# Altium integrated library LEMO Unipole And Multipole Type Connectors.IntLib: 1566 symbols (part 11 of 13) (continued)
## PKG.M0.5GL.NA (continued)
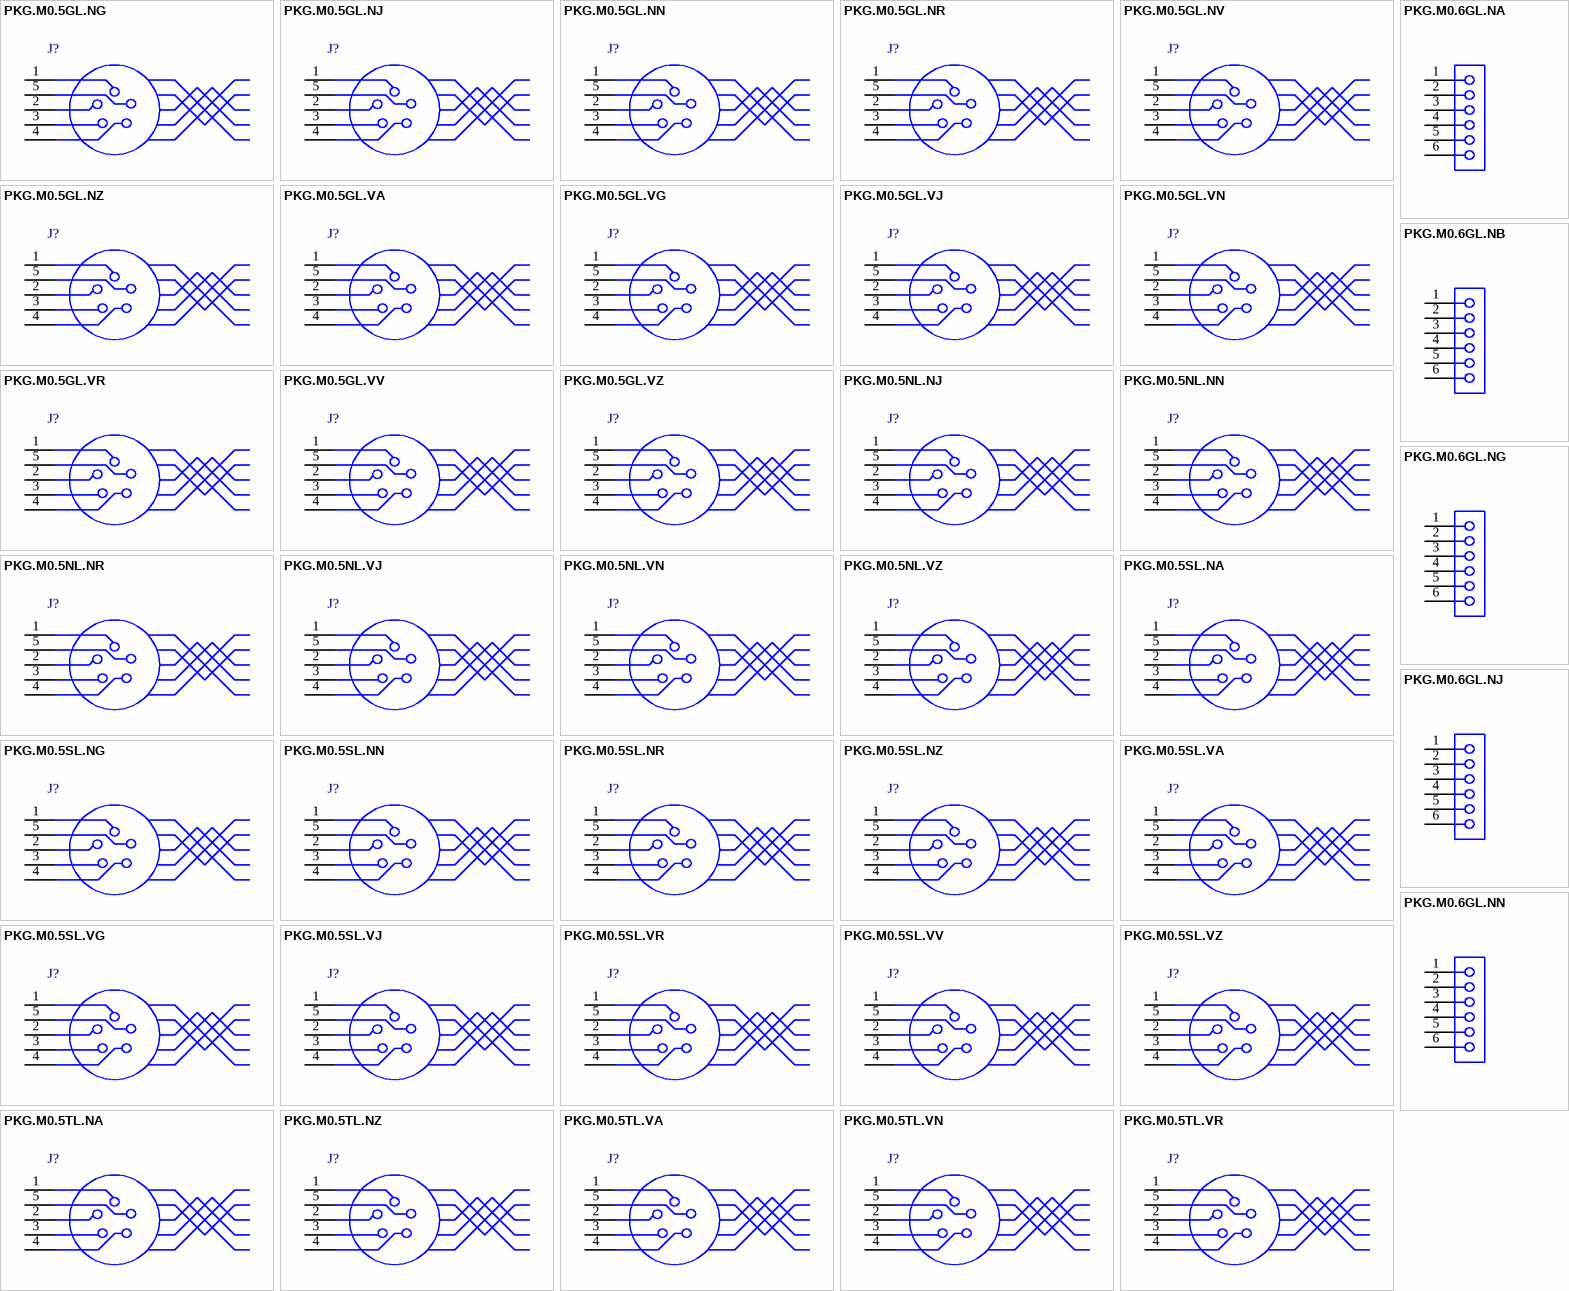
[diagram p35: symbols PKG.M0.5GL.NG to PKG.M0.6GL.NN]

## PKG.M0.5GL.NG
designator J?
Fixed receptacle with two nuts (back panel mounting), straight print contacts, Key (G), P series, Multipole Type with 5 Contacts; Manufacturer: LEMO; PartNumber: PKG.M0.5GL.NG; Number of contacts: 5; Contact Diameter: 0.9 mm; Test voltage (kV rms) Contact-Contact: 1.05; Rated Current(A): 7; DatasheetVersion: Jun-14; PackageReference: PKG.M0.5GL.NG; PackageDescription: Fixed receptacle with two nuts (back panel mounting), straight print contacts, Key(G) for Printed Circuit; ComponentLink1Description: Manufacturer URL; ComponentLink1URL: http://www.lemo.com; ComponentLink2Description: Datasheet; ComponentLink2URL: http://intra.lemo.ch/catalog/ROW/UK_English/P_series_catalog.pdf
footprint PKG.M0.5GL.NG (Socket, Female, Height 33.5 mm, Through hole)
pins: 1, 2, 3, 4, 5

## PKG.M0.5GL.NJ
designator J?
Fixed receptacle with two nuts (back panel mounting), straight print contacts, Key (G), P series, Multipole Type with 5 Contacts; Manufacturer: LEMO; PartNumber: PKG.M0.5GL.NJ; Number of contacts: 5; Contact Diameter: 0.9 mm; Test voltage (kV rms) Contact-Contact: 1.05; Rated Current(A): 7; DatasheetVersion: Jun-14; PackageReference: PKG.M0.5GL.NJ; PackageDescription: Fixed receptacle with two nuts (back panel mounting), straight print contacts, Key(G) for Printed Circuit; ComponentLink1Description: Manufacturer URL; ComponentLink1URL: http://www.lemo.com; ComponentLink2Description: Datasheet; ComponentLink2URL: http://intra.lemo.ch/catalog/ROW/UK_English/P_series_catalog.pdf
footprint PKG.M0.5GL.NJ (Socket, Female, Height 33.5 mm, Through hole)
pins: 1, 2, 3, 4, 5

## PKG.M0.5GL.NN
designator J?
Fixed receptacle with two nuts (back panel mounting), straight print contacts, Key (G), P series, Multipole Type with 5 Contacts; Manufacturer: LEMO; PartNumber: PKG.M0.5GL.NN; Number of contacts: 5; Contact Diameter: 0.9 mm; Test voltage (kV rms) Contact-Contact: 1.05; Rated Current(A): 7; DatasheetVersion: Jun-14; PackageReference: PKG.M0.5GL.NN; PackageDescription: Fixed receptacle with two nuts (back panel mounting), straight print contacts, Key(G) for Printed Circuit; ComponentLink1Description: Manufacturer URL; ComponentLink1URL: http://www.lemo.com; ComponentLink2Description: Datasheet; ComponentLink2URL: http://intra.lemo.ch/catalog/ROW/UK_English/P_series_catalog.pdf
footprint PKG.M0.5GL.NN (Socket, Female, Height 33.5 mm, Through hole)
pins: 1, 2, 3, 4, 5

## PKG.M0.5GL.NR
designator J?
Fixed receptacle with two nuts (back panel mounting), straight print contacts, Key (G), P series, Multipole Type with 5 Contacts; Manufacturer: LEMO; PartNumber: PKG.M0.5GL.NR; Number of contacts: 5; Contact Diameter: 0.9 mm; Test voltage (kV rms) Contact-Contact: 1.05; Rated Current(A): 7; DatasheetVersion: Jun-14; PackageReference: PKG.M0.5GL.NR; PackageDescription: Fixed receptacle with two nuts (back panel mounting), straight print contacts, Key(G) for Printed Circuit; ComponentLink1Description: Manufacturer URL; ComponentLink1URL: http://www.lemo.com; ComponentLink2Description: Datasheet; ComponentLink2URL: http://intra.lemo.ch/catalog/ROW/UK_English/P_series_catalog.pdf
footprint PKG.M0.5GL.NR (Socket, Female, Height 33.5 mm, Through hole)
pins: 1, 2, 3, 4, 5

## PKG.M0.5GL.NV
designator J?
Fixed receptacle with two nuts (back panel mounting), straight print contacts, Key (G), P series, Multipole Type with 5 Contacts; Manufacturer: LEMO; PartNumber: PKG.M0.5GL.NV; Number of contacts: 5; Contact Diameter: 0.9 mm; Test voltage (kV rms) Contact-Contact: 1.05; Rated Current(A): 7; DatasheetVersion: Jun-14; PackageReference: PKG.M0.5GL.NV; PackageDescription: Fixed receptacle with two nuts (back panel mounting), straight print contacts, Key(G) for Printed Circuit; ComponentLink1Description: Manufacturer URL; ComponentLink1URL: http://www.lemo.com; ComponentLink2Description: Datasheet; ComponentLink2URL: http://intra.lemo.ch/catalog/ROW/UK_English/P_series_catalog.pdf
footprint PKG.M0.5GL.NV (Socket, Female, Height 33.5 mm, Through hole)
pins: 1, 2, 3, 4, 5

## PKG.M0.5GL.NZ
designator J?
Fixed receptacle with 1 nut (without 2nd front nut), Key (G), P series, Multipole Type with 5 Contacts; Manufacturer: LEMO; PartNumber: PKG.M0.5GL.NZ; Number of contacts: 5; Contact Diameter: 0.9 mm; Test voltage (kV rms) Contact-Contact: 1.05; Rated Current(A): 7; DatasheetVersion: Jun-14; PackageReference: PKG.M0.5GL.NZ; PackageDescription: Fixed receptacle with 1 nut (without 2nd front nut), Key(G) for Printed Circuit; ComponentLink1Description: Manufacturer URL; ComponentLink1URL: http://www.lemo.com; ComponentLink2Description: Datasheet; ComponentLink2URL: http://intra.lemo.ch/catalog/ROW/UK_English/P_series_catalog.pdf
footprint PKG.M0.5GL.NZ (Socket, Female, Height 25 mm, Through hole)
pins: 1, 2, 3, 4, 5

## PKG.M0.5GL.VA
designator J?
Fixed receptacle with two nuts (back panel mounting), 90° print contacts, Key (G), P series, Multipole Type with 5 Contacts; Manufacturer: LEMO; PartNumber: PKG.M0.5GL.VA; Number of contacts: 5; Contact Diameter: 0.9 mm; Test voltage (kV rms) Contact-Contact: 1.05; Rated Current(A): 7; DatasheetVersion: Jun-14; PackageReference: PKG.M0.5GL.VA; PackageDescription: Fixed receptacle with two nuts (back panel mounting), 90° print contacts, Key(G) for Printed Circuit; ComponentLink1Description: Manufacturer URL; ComponentLink1URL: http://www.lemo.com; ComponentLink2Description: Datasheet; ComponentLink2URL: http://intra.lemo.ch/catalog/ROW/UK_English/P_series_catalog.pdf
footprint PKG.M0.5GL.VA (Socket, Female, Height 33.5 mm, Through hole)
pins: 1, 2, 3, 4, 5

## PKG.M0.5GL.VG
designator J?
Fixed receptacle with two nuts (back panel mounting), 90° print contacts, Key (G), P series, Multipole Type with 5 Contacts; Manufacturer: LEMO; PartNumber: PKG.M0.5GL.VG; Number of contacts: 5; Contact Diameter: 0.9 mm; Test voltage (kV rms) Contact-Contact: 1.05; Rated Current(A): 7; DatasheetVersion: Jun-14; PackageReference: PKG.M0.5GL.VG; PackageDescription: Fixed receptacle with two nuts (back panel mounting), 90° print contacts, Key(G) for Printed Circuit; ComponentLink1Description: Manufacturer URL; ComponentLink1URL: http://www.lemo.com; ComponentLink2Description: Datasheet; ComponentLink2URL: http://intra.lemo.ch/catalog/ROW/UK_English/P_series_catalog.pdf
footprint PKG.M0.5GL.VG (Socket, Female, Height 33.5 mm, Through hole)
pins: 1, 2, 3, 4, 5

## PKG.M0.5GL.VJ
designator J?
Fixed receptacle with two nuts (back panel mounting), 90° print contacts, Key (G), P series, Multipole Type with 5 Contacts; Manufacturer: LEMO; PartNumber: PKG.M0.5GL.VJ; Number of contacts: 5; Contact Diameter: 0.9 mm; Test voltage (kV rms) Contact-Contact: 1.05; Rated Current(A): 7; DatasheetVersion: Jun-14; PackageReference: PKG.M0.5GL.VJ; PackageDescription: Fixed receptacle with two nuts (back panel mounting), 90° print contacts, Key(G) for Printed Circuit; ComponentLink1Description: Manufacturer URL; ComponentLink1URL: http://www.lemo.com; ComponentLink2Description: Datasheet; ComponentLink2URL: http://intra.lemo.ch/catalog/ROW/UK_English/P_series_catalog.pdf
footprint PKG.M0.5GL.VJ (Socket, Female, Height 33.5 mm, Through hole)
pins: 1, 2, 3, 4, 5

## PKG.M0.5GL.VN
designator J?
Fixed receptacle with two nuts (back panel mounting), 90° print contacts, Key (G), P series, Multipole Type with 5 Contacts; Manufacturer: LEMO; PartNumber: PKG.M0.5GL.VN; Number of contacts: 5; Contact Diameter: 0.9 mm; Test voltage (kV rms) Contact-Contact: 1.05; Rated Current(A): 7; DatasheetVersion: Jun-14; PackageReference: PKG.M0.5GL.VN; PackageDescription: Fixed receptacle with two nuts (back panel mounting), 90° print contacts, Key(G) for Printed Circuit; ComponentLink1Description: Manufacturer URL; ComponentLink1URL: http://www.lemo.com; ComponentLink2Description: Datasheet; ComponentLink2URL: http://intra.lemo.ch/catalog/ROW/UK_English/P_series_catalog.pdf
footprint PKG.M0.5GL.VN (Socket, Female, Height 33.5 mm, Through hole)
pins: 1, 2, 3, 4, 5

## PKG.M0.5GL.VR
designator J?
Fixed receptacle with two nuts (back panel mounting), 90° print contacts, Key (G), P series, Multipole Type with 5 Contacts; Manufacturer: LEMO; PartNumber: PKG.M0.5GL.VR; Number of contacts: 5; Contact Diameter: 0.9 mm; Test voltage (kV rms) Contact-Contact: 1.05; Rated Current(A): 7; DatasheetVersion: Jun-14; PackageReference: PKG.M0.5GL.VR; PackageDescription: Fixed receptacle with two nuts (back panel mounting), 90° print contacts, Key(G) for Printed Circuit; ComponentLink1Description: Manufacturer URL; ComponentLink1URL: http://www.lemo.com; ComponentLink2Description: Datasheet; ComponentLink2URL: http://intra.lemo.ch/catalog/ROW/UK_English/P_series_catalog.pdf
footprint PKG.M0.5GL.VR (Socket, Female, Height 33.5 mm, Through hole)
pins: 1, 2, 3, 4, 5

## PKG.M0.5GL.VV
designator J?
Fixed receptacle with two nuts (back panel mounting), 90° print contacts, Key (G), P series, Multipole Type with 5 Contacts; Manufacturer: LEMO; PartNumber: PKG.M0.5GL.VV; Number of contacts: 5; Contact Diameter: 0.9 mm; Test voltage (kV rms) Contact-Contact: 1.05; Rated Current(A): 7; DatasheetVersion: Jun-14; PackageReference: PKG.M0.5GL.VV; PackageDescription: Fixed receptacle with two nuts (back panel mounting), 90° print contacts, Key(G) for Printed Circuit; ComponentLink1Description: Manufacturer URL; ComponentLink1URL: http://www.lemo.com; ComponentLink2Description: Datasheet; ComponentLink2URL: http://intra.lemo.ch/catalog/ROW/UK_English/P_series_catalog.pdf
footprint PKG.M0.5GL.VV (Socket, Female, Height 33.5 mm, Through hole)
pins: 1, 2, 3, 4, 5

## PKG.M0.5GL.VZ
designator J?
Fixed receptacle with 1 nut (without 2nd front nut), Key (G), P series, Multipole Type with 5 Contacts; Manufacturer: LEMO; PartNumber: PKG.M0.5GL.VZ; Number of contacts: 5; Contact Diameter: 0.9 mm; Test voltage (kV rms) Contact-Contact: 1.05; Rated Current(A): 7; DatasheetVersion: Jun-14; PackageReference: PKG.M0.5GL.VZ; PackageDescription: Fixed receptacle with 1 nut (without 2nd front nut), Key(G) for Printed Circuit; ComponentLink1Description: Manufacturer URL; ComponentLink1URL: http://www.lemo.com; ComponentLink2Description: Datasheet; ComponentLink2URL: http://intra.lemo.ch/catalog/ROW/UK_English/P_series_catalog.pdf
footprint PKG.M0.5GL.VZ (Socket, Female, Height 33.5 mm, Through hole)
pins: 1, 2, 3, 4, 5

## PKG.M0.5NL.NJ
designator J?
Fixed receptacle with two nuts (back panel mounting), straight print contacts, Key (G), P series, Multipole Type with 5 Contacts; Manufacturer: LEMO; PartNumber: PKG.M0.5NL.NJ; Number of contacts: 5; Contact Diameter: 0.9 mm; Test voltage (kV rms) Contact-Contact: 1.05; Rated Current(A): 7; DatasheetVersion: Jun-14; PackageReference: PKG.M0.5NL.NJ; PackageDescription: Fixed receptacle with two nuts (back panel mounting), straight print contacts, Key(G) for Printed Circuit; ComponentLink1Description: Manufacturer URL; ComponentLink1URL: http://www.lemo.com; ComponentLink2Description: Datasheet; ComponentLink2URL: http://intra.lemo.ch/catalog/ROW/UK_English/P_series_catalog.pdf
footprint PKG.M0.5NL.NJ (Socket, Female, Height 33.5 mm, Through hole)
pins: 1, 2, 3, 4, 5

## PKG.M0.5NL.NN
designator J?
Fixed receptacle with two nuts (back panel mounting), straight print contacts, Key (G), P series, Multipole Type with 5 Contacts; Manufacturer: LEMO; PartNumber: PKG.M0.5NL.NN; Number of contacts: 5; Contact Diameter: 0.9 mm; Test voltage (kV rms) Contact-Contact: 1.05; Rated Current(A): 7; DatasheetVersion: Jun-14; PackageReference: PKG.M0.5NL.NN; PackageDescription: Fixed receptacle with two nuts (back panel mounting), straight print contacts, Key(G) for Printed Circuit; ComponentLink1Description: Manufacturer URL; ComponentLink1URL: http://www.lemo.com; ComponentLink2Description: Datasheet; ComponentLink2URL: http://intra.lemo.ch/catalog/ROW/UK_English/P_series_catalog.pdf
footprint PKG.M0.5NL.NN (Socket, Female, Height 33.5 mm, Through hole)
pins: 1, 2, 3, 4, 5

## PKG.M0.5NL.NR
designator J?
Fixed receptacle with two nuts (back panel mounting), straight print contacts, Key (G), P series, Multipole Type with 5 Contacts; Manufacturer: LEMO; PartNumber: PKG.M0.5NL.NR; Number of contacts: 5; Contact Diameter: 0.9 mm; Test voltage (kV rms) Contact-Contact: 1.05; Rated Current(A): 7; DatasheetVersion: Jun-14; PackageReference: PKG.M0.5NL.NR; PackageDescription: Fixed receptacle with two nuts (back panel mounting), straight print contacts, Key(G) for Printed Circuit; ComponentLink1Description: Manufacturer URL; ComponentLink1URL: http://www.lemo.com; ComponentLink2Description: Datasheet; ComponentLink2URL: http://intra.lemo.ch/catalog/ROW/UK_English/P_series_catalog.pdf
footprint PKG.M0.5NL.NR (Socket, Female, Height 33.5 mm, Through hole)
pins: 1, 2, 3, 4, 5

## PKG.M0.5NL.VJ
designator J?
Fixed receptacle with two nuts (back panel mounting), 90° print contacts, Key (G), P series, Multipole Type with 5 Contacts; Manufacturer: LEMO; PartNumber: PKG.M0.5NL.VJ; Number of contacts: 5; Contact Diameter: 0.9 mm; Test voltage (kV rms) Contact-Contact: 1.05; Rated Current(A): 7; DatasheetVersion: Jun-14; PackageReference: PKG.M0.5NL.VJ; PackageDescription: Fixed receptacle with two nuts (back panel mounting), 90° print contacts, Key(G) for Printed Circuit; ComponentLink1Description: Manufacturer URL; ComponentLink1URL: http://www.lemo.com; ComponentLink2Description: Datasheet; ComponentLink2URL: http://intra.lemo.ch/catalog/ROW/UK_English/P_series_catalog.pdf
footprint PKG.M0.5NL.VJ (Socket, Female, Height 33.5 mm, Through hole)
pins: 1, 2, 3, 4, 5

## PKG.M0.5NL.VN
designator J?
Fixed receptacle with two nuts (back panel mounting), 90° print contacts, Key (G), P series, Multipole Type with 5 Contacts; Manufacturer: LEMO; PartNumber: PKG.M0.5NL.VN; Number of contacts: 5; Contact Diameter: 0.9 mm; Test voltage (kV rms) Contact-Contact: 1.05; Rated Current(A): 7; DatasheetVersion: Jun-14; PackageReference: PKG.M0.5NL.VN; PackageDescription: Fixed receptacle with two nuts (back panel mounting), 90° print contacts, Key(G) for Printed Circuit; ComponentLink1Description: Manufacturer URL; ComponentLink1URL: http://www.lemo.com; ComponentLink2Description: Datasheet; ComponentLink2URL: http://intra.lemo.ch/catalog/ROW/UK_English/P_series_catalog.pdf
footprint PKG.M0.5NL.VN (Socket, Female, Height 33.5 mm, Through hole)
pins: 1, 2, 3, 4, 5

## PKG.M0.5NL.VZ
designator J?
Fixed receptacle with 1 nut (without 2nd front nut), Key (G), P series, Multipole Type with 5 Contacts; Manufacturer: LEMO; PartNumber: PKG.M0.5NL.VZ; Number of contacts: 5; Contact Diameter: 0.9 mm; Test voltage (kV rms) Contact-Contact: 1.05; Rated Current(A): 7; DatasheetVersion: Jun-14; PackageReference: PKG.M0.5NL.VZ; PackageDescription: Fixed receptacle with 1 nut (without 2nd front nut), Key(G) for Printed Circuit; ComponentLink1Description: Manufacturer URL; ComponentLink1URL: http://www.lemo.com; ComponentLink2Description: Datasheet; ComponentLink2URL: http://intra.lemo.ch/catalog/ROW/UK_English/P_series_catalog.pdf
footprint PKG.M0.5NL.VZ (Socket, Female, Height 33.5 mm, Through hole)
pins: 1, 2, 3, 4, 5

## PKG.M0.5SL.NA
designator J?
Fixed receptacle with two nuts (back panel mounting), straight print contacts, Key (G),  series, Multipole Type with 5 Contacts; Manufacturer: LEMO; PartNumber: PKG.M0.5SL.NA; Number of contacts: 5; Contact Diameter: 0.9 mm; Test voltage (kV rms) Contact-Contact: 1.05; Rated Current(A): 7; DatasheetVersion: Jun-14; PackageReference: PKG.M0.5SL.NA; PackageDescription: Fixed receptacle with two nuts (back panel mounting), straight print contacts, Key(G) for Printed Circuit; Supplier 1: Mouser; Supplier Part Number 1: 736-PKGM05SLNA; Supplier 2: Digi-Key; Supplier Part Number 2: PKG.M0.5SL.NA-ND; ComponentLink1Description: Manufacturer URL; ComponentLink1URL: http://www.lemo.com; ComponentLink2Description: Datasheet; ComponentLink2URL: http://intra.lemo.ch/catalog/ROW/UK_English/P_series_catalog.pdf
footprint PKG.M0.5SL.NA (Socket, Female, Height 33.5 mm, Through hole)
pins: 1, 2, 3, 4, 5

## PKG.M0.5SL.NG
designator J?
Fixed receptacle with two nuts (back panel mounting), straight print contacts, Key (G), P series, Multipole Type with 5 Contacts; Manufacturer: LEMO; PartNumber: PKG.M0.5SL.NG; Number of contacts: 5; Contact Diameter: 0.9 mm; Test voltage (kV rms) Contact-Contact: 1.05; Rated Current(A): 7; DatasheetVersion: Jun-14; PackageReference: PKG.M0.5SL.NG; PackageDescription: Fixed receptacle with two nuts (back panel mounting), straight print contacts, Key(G) for Printed Circuit; Supplier 1: Mouser; Supplier Part Number 1: 736-PKGM05SLNG; Supplier 2: Digi-Key; Supplier Part Number 2: PKG.M0.5SL.NG-ND; ComponentLink1Description: Manufacturer URL; ComponentLink1URL: http://www.lemo.com; ComponentLink2Description: Datasheet; ComponentLink2URL: http://intra.lemo.ch/catalog/ROW/UK_English/P_series_catalog.pdf
footprint PKG.M0.5SL.NG (Socket, Female, Height 33.5 mm, Through hole)
pins: 1, 2, 3, 4, 5

## PKG.M0.5SL.NN
designator J?
Fixed receptacle with two nuts (back panel mounting), straight print contacts, Key (G), P series, Multipole Type with 5 Contacts; Manufacturer: LEMO; PartNumber: PKG.M0.5SL.NN; Number of contacts: 5; Contact Diameter: 0.9 mm; Test voltage (kV rms) Contact-Contact: 1.05; Rated Current(A): 7; DatasheetVersion: Jun-14; PackageReference: PKG.M0.5SL.NN; PackageDescription: Fixed receptacle with two nuts (back panel mounting), straight print contacts, Key(G) for Printed Circuit; Supplier 1: Mouser; Supplier Part Number 1: 736-PKGM05SLNN; Supplier 2: Digi-Key; Supplier Part Number 2: PKG.M0.5SL.NN-ND; ComponentLink1Description: Manufacturer URL; ComponentLink1URL: http://www.lemo.com; ComponentLink2Description: Datasheet; ComponentLink2URL: http://intra.lemo.ch/catalog/ROW/UK_English/P_series_catalog.pdf
footprint PKG.M0.5SL.NN (Socket, Female, Height 33.5 mm, Through hole)
pins: 1, 2, 3, 4, 5

## PKG.M0.5SL.NR
designator J?
Fixed receptacle with two nuts (back panel mounting), straight print contacts, Key (G),  series, Multipole Type with 5 Contacts; Manufacturer: LEMO; PartNumber: PKG.M0.5SL.NR; Number of contacts: 5; Contact Diameter: 0.9 mm; Test voltage (kV rms) Contact-Contact: 1.05; Rated Current(A): 7; DatasheetVersion: Jun-14; PackageReference: PKG.M0.5SL.NR; PackageDescription: Fixed receptacle with two nuts (back panel mounting), straight print contacts, Key(G) for Printed Circuit; Supplier 1: Mouser; Supplier Part Number 1: 736-PKGM05SLNR; Supplier 2: Digi-Key; Supplier Part Number 2: PKG.M0.5SL.NR-ND; ComponentLink1Description: Manufacturer URL; ComponentLink1URL: http://www.lemo.com; ComponentLink2Description: Datasheet; ComponentLink2URL: http://intra.lemo.ch/catalog/ROW/UK_English/P_series_catalog.pdf
footprint PKG.M0.5SL.NR (Socket, Female, Height 33.5 mm, Through hole)
pins: 1, 2, 3, 4, 5

## PKG.M0.5SL.NZ
designator J?
Fixed receptacle with 1 nut (without 2nd front nut), Key (G), P series, Multipole Type with 5 Contacts; Manufacturer: LEMO; PartNumber: PKG.M0.5SL.NZ; Number of contacts: 5; Contact Diameter: 0.9 mm; Test voltage (kV rms) Contact-Contact: 1.05; Rated Current(A): 7; DatasheetVersion: Jun-14; PackageReference: PKG.M0.5SL.NZ; PackageDescription: Fixed receptacle with 1 nut (without 2nd front nut), Key(G) for Printed Circuit; Supplier 1: Mouser; Supplier Part Number 1: 736-PKGM05SLNZ; Supplier 2: Digi-Key; Supplier Part Number 2: PKG.M0.5SL.NZ-ND; ComponentLink1Description: Manufacturer URL; ComponentLink1URL: http://www.lemo.com; ComponentLink2Description: Datasheet; ComponentLink2URL: http://intra.lemo.ch/catalog/ROW/UK_English/P_series_catalog.pdf
footprint PKG.M0.5SL.NZ (Socket, Female, Height 25 mm, Through hole)
pins: 1, 2, 3, 4, 5

## PKG.M0.5SL.VA
designator J?
Fixed receptacle with two nuts (back panel mounting), 90° print contacts, Key (G), P series, Multipole Type with 5 Contacts; Manufacturer: LEMO; PartNumber: PKG.M0.5SL.VA; Number of contacts: 5; Contact Diameter: 0.9 mm; Test voltage (kV rms) Contact-Contact: 1.05; Rated Current(A): 7; DatasheetVersion: Jun-14; PackageReference: PKG.M0.5SL.VA; PackageDescription: Fixed receptacle with two nuts (back panel mounting), 90° print contacts, Key(G) for Printed Circuit; Supplier 1: Mouser; Supplier Part Number 1: 736-PKGM05SLVA; Supplier 2: Digi-Key; Supplier Part Number 2: PKG.M0.5SL.VA-ND; ComponentLink1Description: Manufacturer URL; ComponentLink1URL: http://www.lemo.com; ComponentLink2Description: Datasheet; ComponentLink2URL: http://intra.lemo.ch/catalog/ROW/UK_English/P_series_catalog.pdf
footprint PKG.M0.5SL.VA (Socket, Female, Height 33.5 mm, Through hole)
pins: 1, 2, 3, 4, 5

## PKG.M0.5SL.VG
designator J?
Fixed receptacle with two nuts (back panel mounting), 90° print contacts, Key (G), P series, Multipole Type with 5 Contacts; Manufacturer: LEMO; PartNumber: PKG.M0.5SL.VG; Number of contacts: 5; Contact Diameter: 0.9 mm; Test voltage (kV rms) Contact-Contact: 1.05; Rated Current(A): 7; DatasheetVersion: Jun-14; PackageReference: PKG.M0.5SL.VG; PackageDescription: Fixed receptacle with two nuts (back panel mounting), 90° print contacts, Key(G) for Printed Circuit; Supplier 1: Mouser; Supplier Part Number 1: 736-PKGM05SLVG; Supplier 2: Digi-Key; Supplier Part Number 2: PKG.M0.5SL.VG-ND; ComponentLink1Description: Manufacturer URL; ComponentLink1URL: http://www.lemo.com; ComponentLink2Description: Datasheet; ComponentLink2URL: http://intra.lemo.ch/catalog/ROW/UK_English/P_series_catalog.pdf
footprint PKG.M0.5SL.VG (Socket, Female, Height 33.5 mm, Through hole)
pins: 1, 2, 3, 4, 5

## PKG.M0.5SL.VJ
designator J?
Fixed receptacle with two nuts (back panel mounting), 90° print contacts, Key (G), P series, Multipole Type with 5 Contacts; Manufacturer: LEMO; PartNumber: PKG.M0.5SL.VJ; Number of contacts: 5; Contact Diameter: 0.9 mm; Test voltage (kV rms) Contact-Contact: 1.05; Rated Current(A): 7; DatasheetVersion: Jun-14; PackageReference: PKG.M0.5SL.VJ; PackageDescription: Fixed receptacle with two nuts (back panel mounting), 90° print contacts, Key(G) for Printed Circuit; Supplier 1: Mouser; Supplier Part Number 1: 736-PKGM05SLVJ; Supplier 2: Digi-Key; Supplier Part Number 2: PKG.M0.5SL.VJ-ND; ComponentLink1Description: Manufacturer URL; ComponentLink1URL: http://www.lemo.com; ComponentLink2Description: Datasheet; ComponentLink2URL: http://intra.lemo.ch/catalog/ROW/UK_English/P_series_catalog.pdf
footprint PKG.M0.5SL.VJ (Socket, Female, Height 33.5 mm, Through hole)
pins: 1, 2, 3, 4, 5

## PKG.M0.5SL.VR
designator J?
Fixed receptacle with two nuts (back panel mounting), 90° print contacts, Key (G),  series, Multipole Type with 5 Contacts; Manufacturer: LEMO; PartNumber: PKG.M0.5SL.VR; Number of contacts: 5; Contact Diameter: 0.9 mm; Test voltage (kV rms) Contact-Contact: 1.05; Rated Current(A): 7; DatasheetVersion: Jun-14; PackageReference: PKG.M0.5SL.VR; PackageDescription: Fixed receptacle with two nuts (back panel mounting), 90° print contacts, Key(G) for Printed Circuit; Supplier 1: Mouser; Supplier Part Number 1: 736-PKGM05SLVR; Supplier 2: Digi-Key; Supplier Part Number 2: PKG.M0.5SL.VR-ND; ComponentLink1Description: Manufacturer URL; ComponentLink1URL: http://www.lemo.com; ComponentLink2Description: Datasheet; ComponentLink2URL: http://intra.lemo.ch/catalog/ROW/UK_English/P_series_catalog.pdf
footprint PKG.M0.5SL.VR (Socket, Female, Height 33.5 mm, Through hole)
pins: 1, 2, 3, 4, 5

## PKG.M0.5SL.VV
designator J?
Fixed receptacle with two nuts (back panel mounting), 90° print contacts, Key (G),  series, Multipole Type with 5 Contacts; Manufacturer: LEMO; PartNumber: PKG.M0.5SL.VV; Number of contacts: 5; Contact Diameter: 0.9 mm; Test voltage (kV rms) Contact-Contact: 1.05; Rated Current(A): 7; DatasheetVersion: Jun-14; PackageReference: PKG.M0.5SL.VV; PackageDescription: Fixed receptacle with two nuts (back panel mounting), 90° print contacts, Key(G) for Printed Circuit; Supplier 1: Mouser; Supplier Part Number 1: 736-PKGM05SLVV; Supplier 2: Digi-Key; Supplier Part Number 2: PKG.M0.5SL.VV-ND; ComponentLink1Description: Manufacturer URL; ComponentLink1URL: http://www.lemo.com; ComponentLink2Description: Datasheet; ComponentLink2URL: http://intra.lemo.ch/catalog/ROW/UK_English/P_series_catalog.pdf
footprint PKG.M0.5SL.VV (Socket, Female, Height 33.5 mm, Through hole)
pins: 1, 2, 3, 4, 5

## PKG.M0.5SL.VZ
designator J?
Fixed receptacle with 1 nut (without 2nd front nut), Key (G), P series, Multipole Type with 5 Contacts; Manufacturer: LEMO; PartNumber: PKG.M0.5SL.VZ; Number of contacts: 5; Contact Diameter: 0.9 mm; Test voltage (kV rms) Contact-Contact: 1.05; Rated Current(A): 7; DatasheetVersion: Jun-14; PackageReference: PKG.M0.5SL.VZ; PackageDescription: Fixed receptacle with 1 nut (without 2nd front nut), Key(G) for Printed Circuit; Supplier 1: Mouser; Supplier Part Number 1: 736-PKGM05SLVZ; Supplier 2: Digi-Key; Supplier Part Number 2: PKG.M0.5SL.VZ-ND; ComponentLink1Description: Manufacturer URL; ComponentLink1URL: http://www.lemo.com; ComponentLink2Description: Datasheet; ComponentLink2URL: http://intra.lemo.ch/catalog/ROW/UK_English/P_series_catalog.pdf
footprint PKG.M0.5SL.VZ (Socket, Female, Height 33.5 mm, Through hole)
pins: 1, 2, 3, 4, 5

## PKG.M0.5TL.NA
designator J?
Fixed receptacle with two nuts (back panel mounting), straight print contacts, Key (G), P series, Multipole Type with 5 Contacts; Manufacturer: LEMO; PartNumber: PKG.M0.5TL.NA; Number of contacts: 5; Contact Diameter: 0.9 mm; Test voltage (kV rms) Contact-Contact: 1.05; Rated Current(A): 7; DatasheetVersion: Jun-14; PackageReference: PKG.M0.5TL.NA; PackageDescription: Fixed receptacle with two nuts (back panel mounting), straight print contacts, Key(G) for Printed Circuit; ComponentLink1Description: Manufacturer URL; ComponentLink1URL: http://www.lemo.com; ComponentLink2Description: Datasheet; ComponentLink2URL: http://intra.lemo.ch/catalog/ROW/UK_English/P_series_catalog.pdf
footprint PKG.M0.5TL.NA (Socket, Female, Height 33.5 mm, Through hole)
pins: 1, 2, 3, 4, 5

## PKG.M0.5TL.NZ
designator J?
Fixed receptacle with 1 nut (without 2nd front nut), Key (G), P series, Multipole Type with 5 Contacts; Manufacturer: LEMO; PartNumber: PKG.M0.5TL.NZ; Number of contacts: 5; Contact Diameter: 0.9 mm; Test voltage (kV rms) Contact-Contact: 1.05; Rated Current(A): 7; DatasheetVersion: Jun-14; PackageReference: PKG.M0.5TL.NZ; PackageDescription: Fixed receptacle with 1 nut (without 2nd front nut), Key(G) for Printed Circuit; Supplier 1: Mouser; Supplier Part Number 1: 736-PKGM05TLNZ; Supplier 2: Digi-Key; Supplier Part Number 2: PKG.M0.5TL.NZ-ND; ComponentLink1Description: Manufacturer URL; ComponentLink1URL: http://www.lemo.com; ComponentLink2Description: Datasheet; ComponentLink2URL: http://intra.lemo.ch/catalog/ROW/UK_English/P_series_catalog.pdf
footprint PKG.M0.5TL.NZ (Socket, Female, Height 25 mm, Through hole)
pins: 1, 2, 3, 4, 5

## PKG.M0.5TL.VA
designator J?
Fixed receptacle with two nuts (back panel mounting), 90° print contacts, Key (G), P series, Multipole Type with 5 Contacts; Manufacturer: LEMO; PartNumber: PKG.M0.5TL.VA; Number of contacts: 5; Contact Diameter: 0.9 mm; Test voltage (kV rms) Contact-Contact: 1.05; Rated Current(A): 7; DatasheetVersion: Jun-14; PackageReference: PKG.M0.5TL.VA; PackageDescription: Fixed receptacle with two nuts (back panel mounting), 90° print contacts, Key(G) for Printed Circuit; ComponentLink1Description: Manufacturer URL; ComponentLink1URL: http://www.lemo.com; ComponentLink2Description: Datasheet; ComponentLink2URL: http://intra.lemo.ch/catalog/ROW/UK_English/P_series_catalog.pdf
footprint PKG.M0.5TL.VA (Socket, Female, Height 33.5 mm, Through hole)
pins: 1, 2, 3, 4, 5

## PKG.M0.5TL.VN
designator J?
Fixed receptacle with two nuts (back panel mounting), 90° print contacts, Key (G), P series, Multipole Type with 5 Contacts; Manufacturer: LEMO; PartNumber: PKG.M0.5TL.VN; Number of contacts: 5; Contact Diameter: 0.9 mm; Test voltage (kV rms) Contact-Contact: 1.05; Rated Current(A): 7; DatasheetVersion: Jun-14; PackageReference: PKG.M0.5TL.VN; PackageDescription: Fixed receptacle with two nuts (back panel mounting), 90° print contacts, Key(G) for Printed Circuit; Supplier 1: Mouser; Supplier Part Number 1: 736-PKGM05TLVN; Supplier 2: Digi-Key; Supplier Part Number 2: PKG.M0.5TL.VN-ND; ComponentLink1Description: Manufacturer URL; ComponentLink1URL: http://www.lemo.com; ComponentLink2Description: Datasheet; ComponentLink2URL: http://intra.lemo.ch/catalog/ROW/UK_English/P_series_catalog.pdf
footprint PKG.M0.5TL.VN (Socket, Female, Height 33.5 mm, Through hole)
pins: 1, 2, 3, 4, 5

## PKG.M0.5TL.VR
designator J?
Fixed receptacle with two nuts (back panel mounting), 90° print contacts, Key (G), P series, Multipole Type with 5 Contacts; Manufacturer: LEMO; PartNumber: PKG.M0.5TL.VR; Number of contacts: 5; Contact Diameter: 0.9 mm; Test voltage (kV rms) Contact-Contact: 1.05; Rated Current(A): 7; DatasheetVersion: Jun-14; PackageReference: PKG.M0.5TL.VR; PackageDescription: Fixed receptacle with two nuts (back panel mounting), 90° print contacts, Key(G) for Printed Circuit; ComponentLink1Description: Manufacturer URL; ComponentLink1URL: http://www.lemo.com; ComponentLink2Description: Datasheet; ComponentLink2URL: http://intra.lemo.ch/catalog/ROW/UK_English/P_series_catalog.pdf
footprint PKG.M0.5TL.VR (Socket, Female, Height 33.5 mm, Through hole)
pins: 1, 2, 3, 4, 5

## PKG.M0.6GL.NA
designator J?
Fixed receptacle with two nuts (back panel mounting), straight print contacts, Key (G), P series, Multipole Type with 6 Contacts; Manufacturer: LEMO; PartNumber: PKG.M0.6GL.NA; Number of contacts: 6; Contact Diameter: 0.7 mm; Test voltage (kV rms) Contact-Contact: 1.05; DatasheetVersion: Jun-14; PackageReference: PKG.M0.6GL.NA; PackageDescription: Fixed receptacle with two nuts (back panel mounting), straight print contacts, Key(G) for Printed Circuit; Rated Current(A): 6; ComponentLink1Description: Manufacturer URL; ComponentLink1URL: http://www.lemo.com; ComponentLink2Description: Datasheet; ComponentLink2URL: http://intra.lemo.ch/catalog/ROW/UK_English/P_series_catalog.pdf
footprint PKG.M0.6GL.NA (Socket, Female, Height 33.5 mm, Through hole)
pins: 1, 2, 3, 4, 5, 6
